# Altium footprint library 方林 封装库.PcbLib: 101 footprints (part 7 of 7)
Each footprint in its own frame and in the unit in brackets; x right, y up, seen from the top. Pads: shape width x height; smd on the part's side, far side on the other; paste and mask are expansions set on the pad; w line width, h text height; cw(c..) or ccw(c..) is an arc to the next point about the centre after c.
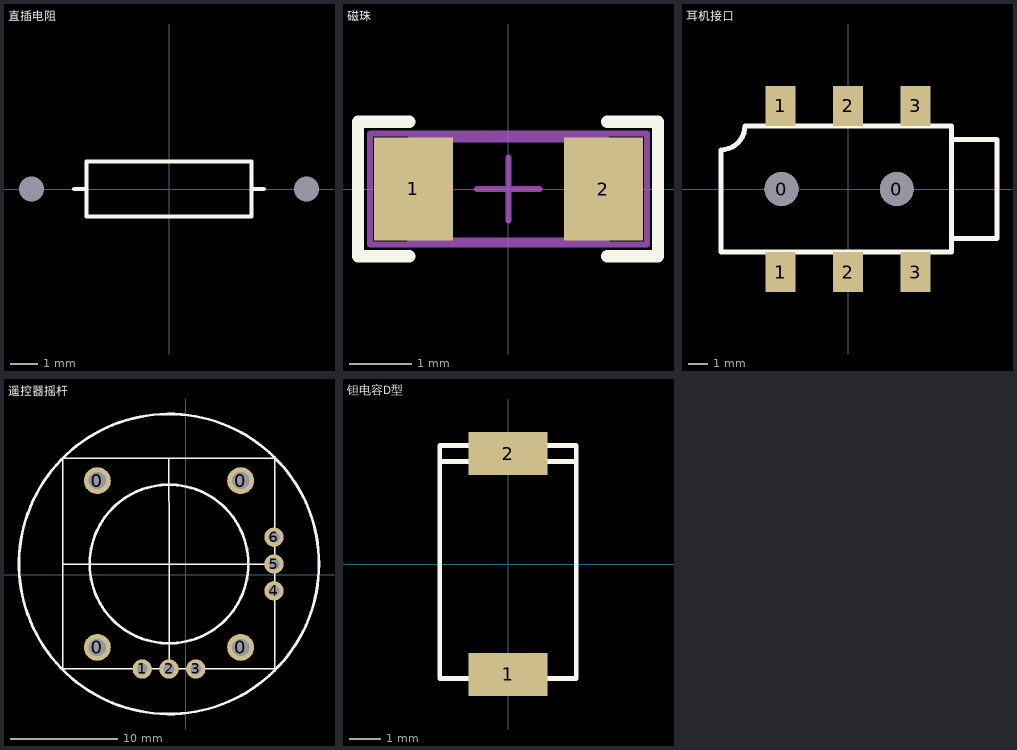
[diagram p6: the footprints below, top view; thin cyan lines are the x and y axes]

## 直插电阻 [mil]
pads (2):
  round 0 / inner round 0 / far side round 100 hole 36 unplated: 1(-200,0) 2(200,0)
Top Overlay:
  lines w6: -137.8,0 -120,0 ; 120,0 137.8,0 ; -120,-40 120,-40 120,40 -120,40 -120,-40
3D body "RESTH_Axial-0.4.STEP": height 102.23, standoff -100, extent -211.81,-50.27 211.81,50.27

## 磁珠 [mil]
pads (2):
  rect 50x65 smd: 1(-60,0) 2(60,0)
Top Overlay:
  lines w7.87: -62.5,-42.5 -95,-42.5 -95,42.5 -62.5,42.5 ; 62.5,-42.5 94.51,-42.5 94.51,42.5 62.5,42.5
Mechanical 13:
  lines w3.94: -62.01,-32.48 -62.01,31.5 62.01,31.5 62.01,-32.48 -62.01,-32.48
Mechanical 15:
  lines w3.94: -19.68,0 19.69,0 ; 0,-19.68 0,19.69 ; -87.5,-35 -87.5,35 87.5,35 87.5,-35 -87.5,-35
3D body: height 51.18, standoff 0, extent -62.01,-32.48 62.01,31.5

## 耳机接口 [mm]
pads (8):
  round 1.7 hole 1.7: 0(-3.35,0) 0(2.45,0)
  rect 1.5x2 smd: 1(-3.4,-4.18) 1(-3.4,4.18) 2(0,-4.18) 2(0,4.18) 3(3.4,-4.18) 3(3.4,4.18)
Top Overlay:
  lines w0.254: 5.2,-2.5 7.5,-2.5 7.5,2.5 5.2,2.5 ; -6.4,-3.18 5.2,-3.18 5.2,3.18 -5.193,3.18 cw(c-6.4,3.18) -6.4,1.973 -6.4,-3.18
3D body "Phone Jack SMT_3.5.STEP": height 4.95, standoff -0.7, extent -6.39,-4.551 7.51,4.399

## 遥控器摇杆 [mm] "摇杆"
pads (10):
  round 2.5 hole 1.6: 0(-8.204,-6.744) 0(-8.204,8.75) 0(5.105,-6.744) 0(5.105,8.75)
  round 1.8 hole 1: 1(-4.039,-8.75) 2(-1.549,-8.75) 3(0.94,-8.75) 4(8.204,-1.486) 5(8.204,1.003) 6(8.204,3.493)
Top Overlay:
  circle w0.254: c-1.549,1.003 r13.934
  circle w0.254: c-1.549,1.003 r7.372
  lines w0.127: -11.405,1.003 -7.366,1.003 8.204,1.003 ; -1.549,10.808 -1.549,2.807 -1.549,-8.75 ; -1.549,-8.75 -11.405,-8.75 -11.405,10.808 -6.147,10.808 8.255,10.808 8.255,-8.75 -1.549,-8.75

## 钽电容D型 [mm]
pads (2):
  rect 2.5x1.36 smd: 1(0,-3.492) 2(0,3.492)
Top Overlay:
  lines w0.152: -2.159,3.238 2.159,3.238 ; -2.159,-3.619 2.159,-3.619 2.159,3.746 -2.159,3.746 -2.159,-3.619
3D body: height 2, standoff 0, extent -1.27,-4.255 1.397,-2.73
3D body: height 2, standoff 0, extent -1.27,2.73 1.27,4.255
3D body: height 4.1, standoff -0.01, extent -2.159,2.73 2.159,3.746
3D body: height 4.1, standoff -0.01, extent -2.159,-3.746 2.159,2.73